# Altium footprint library IDETEC.PcbLib: 275 footprints (part 15 of 18)
Each footprint in its own frame and in the unit in brackets; x right, y up, seen from the top. Pads: shape width x height; smd on the part's side, far side on the other; paste and mask are expansions set on the pad; w line width, h text height; cw(c..) or ccw(c..) is an arc to the next point about the centre after c.
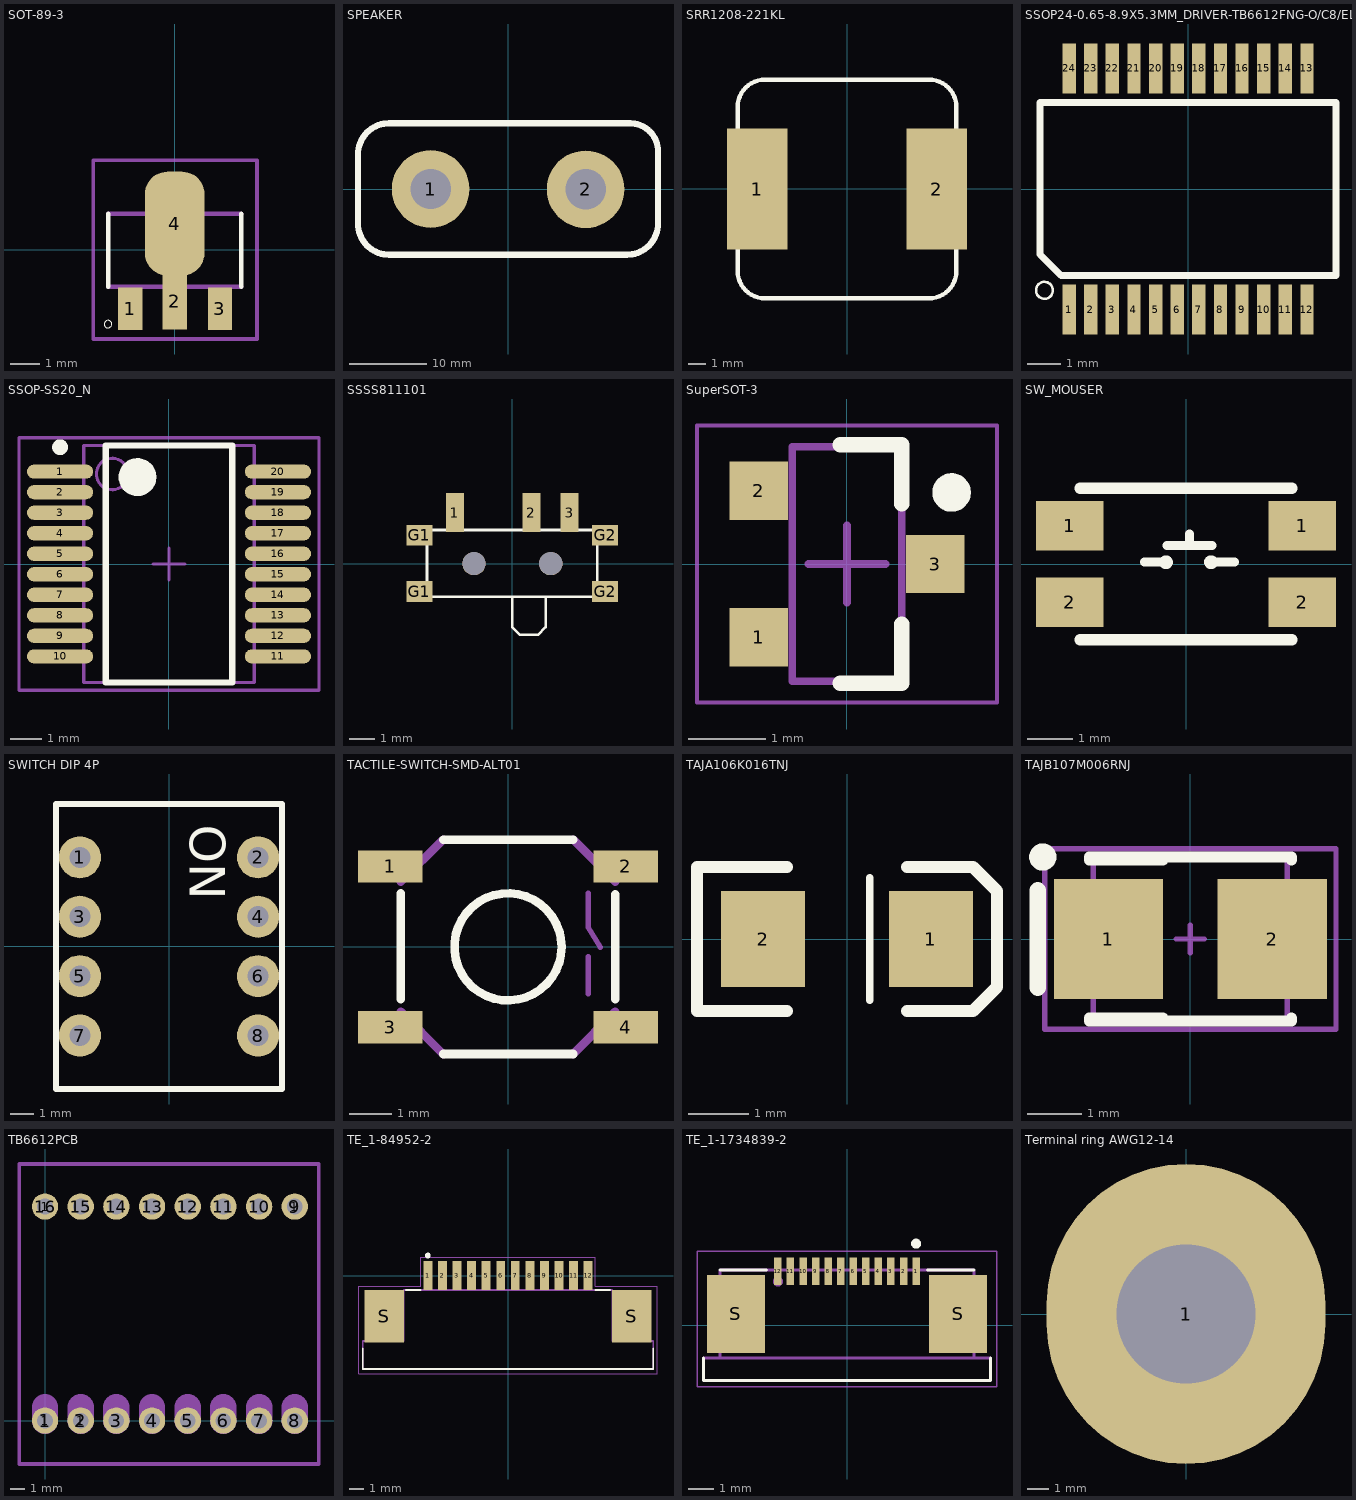
[diagram p14: the footprints below, top view; thin cyan lines are the x and y axes]

## SOT-89-3 [mil]
pads (4):
  rect 32x56 smd: 1(-59.02,-77.99) 3(60,-77.99)
  rect 32x75 smd: 2(0,-67.99)
  rrect75% 79x138 smd: 4(0,35)
Top Overlay:
  circle w0: c-88.58,-98.43 r5
  lines w6: -87.99,-49.02 -87.99,48 ; 88,-49.02 88,48
Mechanical 16:
  rectangle: -68,-83 -50,-50
  rectangle: 50,-83 68,-50
  rectangle: -11,-83 11,-50
  region: 0,0 10,0 10,10 0,10
  lines w6: -87.99,-49.02 88,-49.02 ; -87.99,48 88,48
  lines w8: -31,51 31,51 31,62 14,79 -14,79 -31,62 -31,51
Mechanical 27:
  lines w5: -108.27,-118.11 109,-118.11 109,119 -108.27,119 -108.27,-118.11
3D body "SW3dPS-SOT89.STEP": height 62.57, standoff -0.76, extent -90.92,-91.32 90.18,76

## SPEAKER [mm] "Connector Speaker"
pads (2):
  round 10 hole 5.2: 1(-9.963,0) 2(9.998,-0.035)
Top Overlay:
  lines w0.15: 15.317,8.466 15.736,8.466
  lines w0.8: -19.316,-4.466 ccw(c-15.317,-4.466) -15.317,-8.466 15.317,-8.466 ccw(c15.317,-4.466) 19.316,-4.466 19.316,4.885 ccw(c15.736,4.886) 15.736,8.466 -15.317,8.466 ccw(c-15.317,4.466) -19.316,4.466 -19.316,-4.466
3D body "jack Rojo.STEP": height 29.51, standoff -11.8, extent 2.398,-7.635 17.598,7.565
3D body "jack negro.STEP": height 29.51, standoff -11.8, extent -17.563,-7.6 -2.363,7.6

## SRR1208-221KL [mm] "SRR1208-221KL"
pads (2):
  rect 3.5x7 smd: 1(-5.207,0) 2(5.207,0)
Top Overlay:
  lines w0.254: -6.35,-4.75 ccw(c-4.75,-4.75) -4.75,-6.35 4.75,-6.35 ccw(c4.75,-4.75) 6.35,-4.75 6.35,4.75 ccw(c4.75,4.75) 4.75,6.35 -4.75,6.35 ccw(c-4.75,4.75) -6.35,4.75 -6.35,-4.75
3D body "SW3dPS-DRQ127_12.5x12.5.STEP": height 8, standoff 0, extent -6.25,-6.25 6.25,6.25

## SSOP24-0.65-8.9X5.3MM_DRIVER-TB6612FNG-O/C8/EL(SSOP24)(Primary) [mm]
pads (24):
  rect 0.4x1.5 smd paste-25.4 mask-25.4: 1(-3.575,-3.625) 2(-2.925,-3.625) 3(-2.275,-3.625) 4(-1.625,-3.625) 5(-0.975,-3.625) 6(-0.325,-3.625) 7(0.325,-3.625) 8(0.975,-3.625) 9(1.625,-3.625) 10(2.275,-3.625) 11(2.925,-3.625) 12(3.575,-3.625) 13(3.575,3.625) 14(2.925,3.625) 15(2.275,3.625) 16(1.625,3.625) 17(0.975,3.625) 18(0.325,3.625) 19(-0.325,3.625) 20(-0.975,3.625) 21(-1.625,3.625) 22(-2.275,3.625) 23(-2.925,3.625) 24(-3.575,3.625)
Top Overlay:
  circle w0.076: c-4.318,-3.048 r0.254
  lines w0.203: -4.45,2.575 -4.45,-1.965 -3.815,-2.6 4.45,-2.6 4.45,2.6 -4.45,2.6
Top Paste:
  region: -3.775,2.875 -3.375,2.875 -3.375,4.375 -3.775,4.375
  region: -3.125,2.875 -2.725,2.875 -2.725,4.375 -3.125,4.375
  region: -2.475,2.875 -2.075,2.875 -2.075,4.375 -2.475,4.375
  region: -1.825,2.875 -1.425,2.875 -1.425,4.375 -1.825,4.375
  region: -1.175,2.875 -0.775,2.875 -0.775,4.375 -1.175,4.375
  region: -0.525,2.875 -0.125,2.875 -0.125,4.375 -0.525,4.375
  region: 0.125,2.875 0.525,2.875 0.525,4.375 0.125,4.375
  region: 0.775,2.875 1.175,2.875 1.175,4.375 0.775,4.375
  region: 1.425,2.875 1.825,2.875 1.825,4.375 1.425,4.375
  region: 2.075,2.875 2.475,2.875 2.475,4.375 2.075,4.375
  region: 2.725,2.875 3.125,2.875 3.125,4.375 2.725,4.375
  region: 3.375,2.875 3.775,2.875 3.775,4.375 3.375,4.375
  region: 3.375,-4.375 3.775,-4.375 3.775,-2.875 3.375,-2.875
  region: 2.725,-4.375 3.125,-4.375 3.125,-2.875 2.725,-2.875
  region: 2.075,-4.375 2.475,-4.375 2.475,-2.875 2.075,-2.875
  region: 1.425,-4.375 1.825,-4.375 1.825,-2.875 1.425,-2.875
  region: 0.775,-4.375 1.175,-4.375 1.175,-2.875 0.775,-2.875
  region: 0.125,-4.375 0.525,-4.375 0.525,-2.875 0.125,-2.875
  region: -0.525,-4.375 -0.125,-4.375 -0.125,-2.875 -0.525,-2.875
  region: -1.175,-4.375 -0.775,-4.375 -0.775,-2.875 -1.175,-2.875
  region: -1.825,-4.375 -1.425,-4.375 -1.425,-2.875 -1.825,-2.875
  region: -2.475,-4.375 -2.075,-4.375 -2.075,-2.875 -2.475,-2.875
  region: -3.125,-4.375 -2.725,-4.375 -2.725,-2.875 -3.125,-2.875
  region: -3.775,-4.375 -3.375,-4.375 -3.375,-2.875 -3.775,-2.875
Top Solder:
  region: -3.875,2.775 -3.275,2.775 -3.275,4.475 -3.875,4.475
  region: -3.225,2.775 -2.625,2.775 -2.625,4.475 -3.225,4.475
  region: -2.575,2.775 -1.975,2.775 -1.975,4.475 -2.575,4.475
  region: -1.925,2.775 -1.325,2.775 -1.325,4.475 -1.925,4.475
  region: -1.275,2.775 -0.675,2.775 -0.675,4.475 -1.275,4.475
  region: -0.625,2.775 -0.025,2.775 -0.025,4.475 -0.625,4.475
  region: 0.025,2.775 0.625,2.775 0.625,4.475 0.025,4.475
  region: 0.675,2.775 1.275,2.775 1.275,4.475 0.675,4.475
  region: 1.325,2.775 1.925,2.775 1.925,4.475 1.325,4.475
  region: 1.975,2.775 2.575,2.775 2.575,4.475 1.975,4.475
  region: 2.625,2.775 3.225,2.775 3.225,4.475 2.625,4.475
  region: 3.275,2.775 3.875,2.775 3.875,4.475 3.275,4.475
  region: 3.275,-4.475 3.875,-4.475 3.875,-2.775 3.275,-2.775
  region: 2.625,-4.475 3.225,-4.475 3.225,-2.775 2.625,-2.775
  region: 1.975,-4.475 2.575,-4.475 2.575,-2.775 1.975,-2.775
  region: 1.325,-4.475 1.925,-4.475 1.925,-2.775 1.325,-2.775
  region: 0.675,-4.475 1.275,-4.475 1.275,-2.775 0.675,-2.775
  region: 0.025,-4.475 0.625,-4.475 0.625,-2.775 0.025,-2.775
  region: -0.625,-4.475 -0.025,-4.475 -0.025,-2.775 -0.625,-2.775
  region: -1.275,-4.475 -0.675,-4.475 -0.675,-2.775 -1.275,-2.775
  region: -1.925,-4.475 -1.325,-4.475 -1.325,-2.775 -1.925,-2.775
  region: -2.575,-4.475 -1.975,-4.475 -1.975,-2.775 -2.575,-2.775
  region: -3.225,-4.475 -2.625,-4.475 -2.625,-2.775 -3.225,-2.775
  region: -3.875,-4.475 -3.275,-4.475 -3.275,-2.775 -3.875,-2.775
3D body "User Library-SSOP 24 PIN_.STEP": height 1.93, standoff -0.06, extent -4.315,-3.95 4.315,3.95

## SSOP-SS20_N [mm] "SOP, 20-Leads, Body 7.2x5.2mm, Pitch 0.65mm, IPC Medium Density"
height 2
pads (20):
  oval 2.1x0.45 smd: 1(-3.45,2.925) 2(-3.45,2.275) 3(-3.45,1.625) 4(-3.45,0.975) 5(-3.45,0.325) 6(-3.45,-0.325) 7(-3.45,-0.975) 8(-3.45,-1.625) 9(-3.45,-2.275) 10(-3.45,-2.925) 11(3.45,-2.925) 12(3.45,-2.275) 13(3.45,-1.625) 14(3.45,-0.975) 15(3.45,-0.325) 16(3.45,0.325) 17(3.45,0.975) 18(3.45,1.625) 19(3.45,2.275) 20(3.45,2.925)
Top Overlay:
  circle w0.25: c-3.45,3.7 r0.125
  circle w0.6: c-1,2.75 r0.3
  lines w0.2: -2,-3.75 -2,3.75 2,3.75 2,-3.75 -2,-3.75
Mechanical 13:
  circle w0.1: c-1.8,2.85 r0.5
  lines w0.1: -2.7,-3.75 -2.7,3.75 2.7,3.75 2.7,-3.75 -2.7,-3.75
Mechanical 15:
  lines w0.1: -0.5,0 0.5,0 ; 0,-0.5 0,0.5 ; -4.75,-4 -4.75,4 4.75,4 4.75,-4 -4.75,-4
3D body "SW3dPS-SSOP_20.STEP": height 1.8, standoff -0.04, extent -3.95,-3.65 3.95,3.65

## SSSS811101 [mil] "Interruptores corredizos SPDT HORZ GRND 1.5mm"
height 55.12
pads (9):
  rect 28x60 smd: 1(-88.58,79) 2(30,79) 3(89,79)
  rect 40x32 smd: G1(-143.7,-43.31) G1(-143.7,44) G2(144,-43.31) G2(144,44)
  round 36 hole 36 unplated: ""(-59.06,0) ""(60,0)
Top Overlay:
  lines w4: 0,-51.18 0,-98.43 12,-110.24 40,-110.24 52,-98.43 52,-51.18 ; 0,-51.18 52,-51.18 ; 0,-51.18 -131.89,-51.18 -131.89,52 132,52 132,-51.18 52,-51.18
3D body "User Library-688-SSSS811101.STEP": height 45.67, standoff -19.68, extent -151.57,-110.23 151.58,86.62

## SuperSOT-3 [mm] "SOT23, 3-Leads, Body 2,98x2,52mm, Pitch 0,95mm, IPC Medium Density"
height 0.93
pads (3):
  rect 0.76x0.76 smd: 1(-1.145,-0.95) 2(-1.145,0.95) 3(1.145,0)
Top Overlay:
  circle w0.25: c1.36,0.93 r0.125
  lines w0.2: -0.09,-1.55 0.71,-1.55 0.71,-0.78 ; -0.09,1.55 0.71,1.55 0.71,0.78
Mechanical 13:
  lines w0.1: -0.71,-1.525 -0.71,1.525 0.71,1.525 0.71,-1.525 -0.71,-1.525
Mechanical 15:
  lines w0.05: -1.95,-1.8 -1.95,1.8 1.95,1.8 1.95,-1.8 -1.95,-1.8
  lines w0.1: -0.5,0 0.5,0 ; 0,-0.5 0,0.5
3D body "User Library-SOT-23-3-1.STEP": height 1.1, standoff 0, extent -1.292,-1.51 1.25,1.49

## SW_MOUSER [mm]
pads (4):
  rect 1.5x1.1 smd: 1(-2.575,0.85) 1(2.575,0.85) 2(-2.575,-0.85) 2(2.575,-0.85)
Top Overlay:
  circle w0.254: c0.555,0.04 r0.025
  circle w0.254: c-0.445,0.04 r0.025
  lines w0.2: -0.92,0.04 -0.42,0.04 ; -0.42,0.415 0.58,0.415 ; 0.08,0.415 0.08,0.665 ; 0.58,0.04 1.08,0.04
  lines w0.254: -2.35,-1.68 2.35,-1.68 ; -2.35,1.68 2.35,1.68
3D body "OMRON B3U1000P.STEP": height 1.6, standoff 0, extent -1.92,-1.21 2.08,1.29

## SWITCH DIP 4P [mm] "SWITCH DIP 4P"
pads (8):
  round 1.8 hole 0.9: 1(-3.81,3.81) 2(3.81,3.81) 3(-3.81,1.27) 4(3.81,1.27) 5(-3.81,-1.27) 6(3.81,-1.27) 7(-3.81,-3.81) 8(3.81,-3.81)
Top Overlay:
  lines w0.254: -4.825,6.095 4.825,6.095 ; -4.825,6.096 -4.825,-6.096 4.825,-6.096 4.825,6.096
  text "ON" at 0.889,5.207 h1.52
3D body "da04v.stp": height 7.2, standoff -2.81, extent -7.851,-5.76 4.949,5.76

## TACTILE-SWITCH-SMD-ALT01 [mil] "TACTILE-SWITCH-SMD-ALT01"
pads (4):
  rect 60x30 smd: 1(-110,75) 2(110,75) 3(-110,-75) 4(110,-75)
Top Overlay:
  circle w8: c0,0 r50
  lines w8: -100,-48.82 -100,50 ; -60.63,-100 61,-100 ; -60.63,100 61,100 ; 100,-48.82 100,49
Mechanical 16:
  lines w5: 75,-43.9 75,-9.06 ; 75,50 75,18 86,-0.39
  lines w8: -100,-60.63 -60.63,-100 ; -100,61 -60.63,100 ; 61,-100 100,-60.63 ; 61,100 100,61
3D body "8720b.STEP": height 62.99, standoff 0, extent -125.98,-102.35 125.99,102.37

## TAJA106K016TNJ [mm] "1206"
pads (2):
  rect 1.4x1.6 smd: 1(1.4,0) 2(-1.4,0)
Top Overlay:
  lines w0.127: 0.381,-1.016 0.381,1.016
  lines w0.203: -1,-1.2 -2.5,-1.2 -2.5,1.2 -1,1.2 ; 1,-1.2 2.1,-1.2 2.5,-0.8 2.5,0.8 2.1,1.2 1,1.2
3D body "User Library-CAP_TANT_3216-18_A_case.STEP": height 1.8, standoff 0, extent -1.7,-0.9 1.7,0.9

## TAJB107M006RNJ [mm] "Capacitor, SM Tantalum; Body 3.5 x 2.8 mm (LxW typ)"
height 2.1
pads (2):
  rect 2x2.2 smd: 1(-1.5,0) 2(1.5,0)
Top Overlay:
  circle w0.25: c-2.7,1.5 r0.125
  lines w0.2: -1.85,-1.5 1.85,-1.5 1.85,-1.45 ; -1.85,-1.45 -0.5,-1.45 ; -1.85,1.45 -0.5,1.45 ; -1.85,1.5 1.85,1.5 1.85,1.45
  lines w0.305: -2.794,-0.889 -2.794,0.889
Mechanical 13:
  lines w0.1: -1.778,-1.524 -1.778,1.524 1.778,1.524 1.778,-1.524 -1.778,-1.524
Mechanical 15:
  lines w0.1: -0.254,0 0.254,0 ; 0,-0.254 0,0.254 ; -2.667,-1.651 2.667,-1.651 2.667,1.651 -2.667,1.651 -2.667,-1.651
3D body "User Library-Cap-Tantalum-Case-B-3528-21.step": height 1.9, standoff 0, extent -1.75,-1.403 1.75,1.397

## TB6612PCB [mil]
pads (20):
  round 74 hole 44: 1(0,0) 2(100,0) 3(200,0) 4(300,0) 5(400,0) 6(500,0) 7(600,0) 8(700,0) 9(700,600) 10(600,600) 11(500,600) 12(400,600) 13(300,600) 14(200,600) 15(100,600) 16(0,600)
  round 44 hole 44: 1(0,0) 1(0,600) 1(100,0) 1(700,600)
Top Solder:
  lines w82: 0,-37 0,0 ; 0,600 0,637 ; 100,-37 100,0 ; 100,600 100,637 ; 200,-37 200,0 ; 200,600 200,637 ; 300,-37 300,0 ; 300,600 300,637 ; 400,-37 400,0 ; 400,600 400,637 ; 500,-37 500,0 ; 500,600 500,637 ; 600,-37 600,0 ; 600,600 600,637 ; 700,-37 700,0 ; 700,600 700,637
Bottom Solder:
  lines w82: 0,-37 0,0 ; 0,600 0,637 ; 100,-37 100,0 ; 100,600 100,637 ; 200,-37 200,0 ; 200,600 200,637 ; 300,-37 300,0 ; 300,600 300,637 ; 400,-37 400,0 ; 400,600 400,637 ; 500,-37 500,0 ; 500,600 500,637 ; 600,-37 600,0 ; 600,600 600,637 ; 700,-37 700,0 ; 700,600 700,637
Mechanical 16:
  lines w10: -71.81,-121.65 -71.81,719.25 766.89,719.25 766.89,-121.65 -71.81,-121.65
Mechanical 18:
  lines w74: 0,0 0,37 ; 100,0 100,37 ; 200,0 200,37 ; 300,0 300,37 ; 400,0 400,37 ; 500,0 500,37 ; 600,0 600,37 ; 700,0 700,37
3D body "User Library-Motor Driver.STEP": height 474.15, standoff 333.65, extent -65.6,-106.23 760.39,716.78
3D body "User Library-Header _Fem_1X8.STEP": height 334.65, standoff -125.98, extent -59.09,-54.68 760.6,45.32
3D body "User Library-Header _Fem_1X8.STEP": height 334.65, standoff -125.98, extent -60.6,554.68 759.09,654.68

## TE_1-84952-2 [mm]
pads (14):
  rect 0.61x2 smd: 1(-5.5,0) 2(-4.5,0) 3(-3.5,0) 4(-2.5,0) 5(-1.5,0) 6(-0.5,0) 7(0.5,0) 8(1.5,0) 9(2.5,0) 10(3.5,0) 11(4.5,0) 12(5.5,0)
  rect 2.68x3.6 smd: S(-8.49,-2.8) S(8.49,-2.8)
Top Overlay:
  circle w0.2: c-5.5,1.373 r0.1
  lines w0.127: -9.96,-5 -9.96,-6.4 9.96,-6.4 9.96,-5 ; -7,-1 -6,-1 ; 6,-1 7,-1
Mechanical 16:
  lines w0.127: -9.96,-6.4 9.96,-6.4 9.96,-4.5 7.15,-4.5 7.15,-1 -7.15,-1 -7.15,-4.5 -9.96,-4.5 -9.96,-6.4
Mechanical 27:
  lines w0.05: -10.25,-6.75 10.25,-6.75 10.25,-0.75 6,-0.75 6,1.25 -6,1.25 -6,-0.75 -10.25,-0.75 -10.25,-6.75
3D body "c-1-84952-2-a-3d.stp": height 2.54, standoff -0.02, extent -9.96,-6.491 9.96,0.049

## TE_1-1734839-2 [mm]
pads (14):
  rect 0.3x1.1 smd: 1(2.75,2.15) 2(2.25,2.15) 3(1.75,2.15) 4(1.25,2.15) 5(0.75,2.15) 6(0.25,2.15) 7(-0.25,2.15) 8(-0.75,2.15) 9(-1.25,2.15) 10(-1.75,2.15) 11(-2.25,2.15) 12(-2.75,2.15)
  rect 2.3x3.1 smd: S(-4.42,0.45) S(4.42,0.45)
Top Overlay:
  circle w0.2: c2.75,3.25 r0.1
  lines w0.127: -5.715,-1.3 -5.715,-2.2 5.715,-2.2 5.715,-1.3 ; -5.06,2.2 -3.2,2.2 ; 3.2,2.2 5.06,2.2
Mechanical 16:
  circle w0.2: c-2.75,1.746 r0.1
  lines w0.127: -5.06,-1.3 -5.06,2.2 5.06,2.2 5.06,-1.3 ; -5.06,-1.3 5.06,-1.3 ; -5.06,-1.3 -5.715,-1.3 -5.715,-2.2 5.715,-2.2 5.715,-1.3 5.06,-1.3
Mechanical 27:
  lines w0.05: -5.965,-2.45 -5.965,2.95 5.965,2.95 5.965,-2.45 -5.965,-2.45
3D body "c-1-1735842-2-b-3d.stp": height 2.1, standoff 0, extent -5.715,-2.54 5.715,2.56

## Terminal ring AWG12-14 [mm]
height 5
pads (1):
  oval 13x14 hole 6.5 unplated: 1(0,0)
3D body "User Library-Terminal Ring AWG 10-12.STEP": height 5.71, standoff -1.91, extent -6.2,-6.082 5.864,22.175
3D body "tornillo.STEP": height 6.79, standoff -7.05, extent -6.51,-6.39 6.19,6.31